# Altium footprint library Generic Footprint.PcbLib: 160 footprints (part 15 of 20) (continued)
## Symbol_FCC-Logo-3x2mm_Silkscreen [mm] (continued)
1(1.586,1.464) 1(1.586,1.64) 1(1.586,1.957) 1(1.586,1.963) 1(1.589,0.138) 1(1.589,0.457) 1(1.589,0.634) 1(1.589,0.641) 1(1.589,0.644) 1(1.589,0.648) 1(1.589,0.651) 1(1.589,1.453) 1(1.589,1.457) 1(1.589,1.46) 1(1.589,1.464) 1(1.589,1.467) 1(1.589,1.651) 1(1.589,1.957) 1(1.589,1.96) 1(1.593,0.454) 1(1.593,0.457) 1(1.593,0.461) 1(1.593,0.637) 1(1.593,0.641) 1(1.593,0.644) 1(1.593,1.464) 1(1.593,1.467) 1(1.593,1.47) 1(1.593,1.644) 1(1.593,1.651) 1(1.593,1.967) 1(1.596,0.134) 1(1.596,0.454) 1(1.596,0.631) 1(1.596,0.634) 1(1.596,1.474) 1(1.596,1.647) 1(1.596,1.657) 1(1.596,1.96) 1(1.596,1.963) 1(1.6,0.45) 1(1.6,0.627) 1(1.6,0.637) 1(1.6,1.467) 1(1.6,1.47) 1(1.6,1.477) 1(1.6,1.651) 1(1.6,1.657) 1(1.603,0.444) 1(1.603,0.624) 1(1.603,0.627) 1(1.603,0.631) 1(1.603,0.634) 1(1.603,1.47) 1(1.603,1.474) 1(1.603,1.481) 1(1.603,1.654) 1(1.603,1.661) 1(1.603,1.963) 1(1.603,1.97) 1(1.606,0.131) 1(1.606,0.138) 1(1.606,0.44) 1(1.606,0.444) 1(1.606,0.62) 1(1.606,0.624) 1(1.606,0.631) 1(1.606,1.474) 1(1.606,1.481) 1(1.606,1.484) 1(1.606,1.664) 1(1.606,1.967) 1(1.606,1.97) 1(1.606,1.974) 1(1.61,0.127) 1(1.61,0.138) 1(1.61,0.437) 1(1.61,0.44) 1(1.61,0.447) 1(1.61,0.617) 1(1.61,0.62) 1(1.61,0.624) 1(1.61,0.627) 1(1.61,1.481) 1(1.61,1.484) 1(1.61,1.487) 1(1.61,1.657) 1(1.61,1.661) 1(1.61,1.664) 1(1.61,1.967) 1(1.61,1.97) 1(1.613,0.131) 1(1.613,0.134) 1(1.613,0.433) 1(1.613,0.437) 1(1.613,0.44) 1(1.613,0.444) 1(1.613,0.614) 1(1.613,1.491) 1(1.613,1.661) 1(1.613,1.671) 1(1.613,1.97) 1(1.613,1.974) 1(1.613,1.977) 1(1.617,0.134) 1(1.617,0.43) 1(1.617,0.433) 1(1.617,0.437) 1(1.617,0.61) 1(1.617,0.617) 1(1.617,0.62) 1(1.617,1.484) 1(1.617,1.487) 1(1.617,1.494) 1(1.617,1.664) 1(1.617,1.671) 1(1.617,1.97) 1(1.62,0.124) 1(1.62,0.127) 1(1.62,0.131) 1(1.62,0.603) 1(1.62,0.607) 1(1.62,0.617) 1(1.62,1.487) 1(1.62,1.491) 1(1.62,1.494) 1(1.62,1.498) 1(1.62,1.974) 1(1.62,1.977) 1(1.62,1.98) 1(1.623,0.43) 1(1.623,0.6) 1(1.623,0.607) 1(1.623,1.491) 1(1.623,1.498) 1(1.623,1.501) 1(1.623,1.668) 1(1.627,0.433) 1(1.627,0.603) 1(1.627,0.607) 1(1.627,1.494) 1(1.627,1.498) 1(1.627,1.501) 1(1.627,1.504) 1(1.627,1.671) 1(1.627,1.977) 1(1.627,1.98) 1(1.627,1.984) 1(1.63,0.121) 1(1.63,0.124) 1(1.63,0.127) 1(1.63,0.597) 1(1.63,0.6) 1(1.63,1.508) 1(1.63,1.678) 1(1.634,0.43) 1(1.634,0.593) 1(1.634,0.597) 1(1.634,0.603) 1(1.634,1.501) 1(1.634,1.504) 1(1.634,1.511) 1(1.634,1.674) 1(1.634,1.678) 1(1.634,1.681) 1(1.634,1.98) 1(1.634,1.987) 1(1.637,0.117) 1(1.637,0.124) 1(1.637,0.427) 1(1.637,0.59) 1(1.637,0.593) 1(1.637,0.6) 1(1.637,1.504) 1(1.637,1.508) 1(1.637,1.515) 1(1.637,1.678) 1(1.637,1.681) 1(1.637,1.688) 1(1.64,0.121) 1(1.64,0.423) 1(1.64,0.586) 1(1.64,0.59) 1(1.64,0.597) 1(1.64,1.508) 1(1.64,1.515) 1(1.64,1.518) 1(1.64,1.681) 1(1.644,0.114) 1(1.644,0.121) 1(1.644,0.413) 1(1.644,0.583) 1(1.644,0.586) 1(1.644,0.59) 1(1.644,0.593) 1(1.644,1.515) 1(1.644,1.518) 1(1.644,1.521) 1(1.644,1.688) 1(1.644,1.691) 1(1.644,1.991) 1(1.647,0.11) 1(1.647,0.42) 1(1.647,0.58) 1(1.647,1.525) 1(1.647,1.685) 1(1.651,0.41) 1(1.651,0.413) 1(1.651,0.416) 1(1.651,0.583) 1(1.651,0.586) 1(1.651,1.518) 1(1.651,1.521) 1(1.651,1.688) 1(1.651,1.691) 1(1.651,1.695) 1(1.651,1.994) 1(1.654,0.107) 1(1.654,0.406) 1(1.654,0.573) 1(1.654,0.576) 1(1.654,0.58) 1(1.654,1.991) 1(1.657,0.406) 1(1.657,0.41) 1(1.657,0.413) 1(1.657,0.58) 1(1.657,0.583) 1(1.657,1.521) 1(1.657,1.525) 1(1.657,1.532) 1(1.657,1.691) 1(1.657,1.695) 1(1.657,1.991) 1(1.661,0.399) 1(1.661,0.41) 1(1.661,0.569) 1(1.661,0.573) 1(1.661,1.525) 1(1.661,1.528) 1(1.661,1.532) 1(1.661,1.535) 1(1.661,1.994) 1(1.661,1.997) 1(1.664,0.11) 1(1.664,0.566) 1(1.664,0.569) 1(1.664,1.538) 1(1.664,1.695) 1(1.668,0.104) 1(1.668,0.11) 1(1.668,0.399) 1(1.668,0.406) 1(1.668,0.573) 1(1.668,1.532) 1(1.668,1.535) 1(1.668,1.542) 1(1.668,1.698) 1(1.671,0.107) 1(1.671,0.396) 1(1.671,0.563) 1(1.671,0.569) 1(1.671,1.535) 1(1.671,1.538) 1(1.671,1.994) 1(1.671,1.997) 1(1.671,2.001) 1(1.674,0.403) 1(1.674,0.559) 1(1.674,0.566) 1(1.674,1.538) 1(1.674,1.545) 1(1.674,1.702) 1(1.674,1.708) 1(1.678,0.396) 1(1.678,0.552) 1(1.678,0.556) 1(1.678,0.559) 1(1.678,0.563) 1(1.678,0.566) 1(1.678,1.549) 1(1.678,1.708) 1(1.678,1.712) 1(1.678,1.997) 1(1.678,2.001) 1(1.678,2.004) 1(1.681,0.1) 1(1.681,0.107) 1(1.681,0.399) 1(1.681,0.563) 1(1.681,1.552) 1(1.681,1.705) 1(1.685,0.097) 1(1.685,0.104) 1(1.685,0.396) 1(1.685,0.549) 1(1.685,0.559) 1(1.685,1.549) 1(1.685,1.712) 1(1.685,2.008) 1(1.688,0.097) 1(1.688,0.104) 1(1.688,1.015) 1(1.688,1.018) 1(1.688,1.022) 1(1.688,1.025) 1(1.688,1.028) 1(1.688,1.032) 1(1.688,1.035) 1(1.688,1.039) 1(1.688,1.042) 1(1.688,1.045) 1(1.688,1.049) 1(1.688,1.052) 1(1.688,1.056) 1(1.688,1.059) 1(1.688,1.062) 1(1.688,1.066) 1(1.688,1.069) 1(1.688,1.073) 1(1.688,1.076) 1(1.688,1.079) 1(1.688,1.083) 1(1.688,1.086) 1(1.688,1.555) 1(1.688,1.708) 1(1.688,1.715) 1(1.688,1.719) 1(1.691,0.093) 1(1.691,0.1) 1(1.691,0.393) 1(1.691,0.546) 1(1.691,0.549) 1(1.691,0.552) 1(1.691,0.991) 1(1.691,0.994) 1(1.691,0.998) 1(1.691,1.001) 1(1.691,1.005) 1(1.691,1.008) 1(1.691,1.011) 1(1.691,1.018) 1(1.691,1.022) 1(1.691,1.025) 1(1.691,1.028) 1(1.691,1.032) 1(1.691,1.035) 1(1.691,1.039) 1(1.691,1.042) 1(1.691,1.045) 1(1.691,1.049) 1(1.691,1.052) 1(1.691,1.056) 1(1.691,1.059) 1(1.691,1.062) 1(1.691,1.066) 1(1.691,1.069) 1(1.691,1.073) 1(1.691,1.076) 1(1.691,1.079) 1(1.691,1.083) 1(1.691,1.086) 1(1.691,1.09) 1(1.691,1.093) 1(1.691,1.096) 1(1.691,1.1) 1(1.691,1.103) 1(1.691,1.107) 1(1.691,1.11) 1(1.691,1.113) 1(1.691,1.549) 1(1.691,1.552) 1(1.691,1.559) 1(1.691,1.712) 1(1.691,1.719) 1(1.691,2.001) 1(1.691,2.004) 1(1.691,2.008) 1(1.691,2.011) 1(1.695,0.382) 1(1.695,0.389) 1(1.695,0.552) 1(1.695,0.991) 1(1.695,0.994) 1(1.695,0.998) 1(1.695,1.001) 1(1.695,1.005) 1(1.695,1.008) 1(1.695,1.011) 1(1.695,1.018) 1(1.695,1.022) 1(1.695,1.025) 1(1.695,1.028) 1(1.695,1.032) 1(1.695,1.035) 1(1.695,1.039) 1(1.695,1.042) 1(1.695,1.045) 1(1.695,1.049) 1(1.695,1.052) 1(1.695,1.056) 1(1.695,1.059) 1(1.695,1.062) 1(1.695,1.066) 1(1.695,1.069) 1(1.695,1.073) 1(1.695,1.076) 1(1.695,1.079) 1(1.695,1.083) 1(1.695,1.086) 1(1.695,1.093) 1(1.695,1.096) 1(1.695,1.1) 1(1.695,1.103) 1(1.695,1.107) 1(1.695,1.11) 1(1.695,1.113) 1(1.695,1.552) 1(1.695,1.555) 1(1.695,1.562) 1(1.695,1.715) 1(1.695,1.722) 1(1.698,0.542) 1(1.698,0.991) 1(1.698,0.994) 1(1.698,0.998) 1(1.698,1.001) 1(1.698,1.005) 1(1.698,1.008) 1(1.698,1.096) 1(1.698,1.1) 1(1.698,1.103) 1(1.698,1.107) 1(1.698,1.11) 1(1.698,1.555) 1(1.698,1.559) 1(1.698,1.566) 1(1.698,1.715) 1(1.698,2.004) 1(1.698,2.008) 1(1.702,0.09) 1(1.702,0.093) 1(1.702,0.097) 1(1.702,0.1) 1(1.702,0.379) 1(1.702,0.382) 1(1.702,0.386) 1(1.702,0.539) 1(1.702,0.549) 1(1.702,0.947) 1(1.702,0.954) 1(1.702,1.011) 1(1.702,1.093) 1(1.702,1.113) 1(1.702,1.151) 1(1.702,1.158) 1(1.702,1.562) 1(1.702,1.722) 1(1.702,1.725) 1(1.702,2.014) 1(1.705,0.535) 1(1.705,0.539) 1(1.705,0.542) 1(1.705,0.933) 1(1.705,0.937) 1(1.705,0.94) 1(1.705,0.947) 1(1.705,0.954) 1(1.705,0.971) 1(1.705,0.974) 1(1.705,0.977) 1(1.705,0.981) 1(1.705,0.984) 1(1.705,0.988) 1(1.705,1.117) 1(1.705,1.12) 1(1.705,1.124) 1(1.705,1.127) 1(1.705,1.13) 1(1.705,1.151) 1(1.705,1.158) 1(1.705,1.161) 1(1.705,1.164) 1(1.705,1.168) 1(1.705,1.171) 1(1.705,1.559) 1(1.705,1.562) 1(1.705,1.569) 1(1.705,1.719) 1(1.705,1.725) 1(1.705,1.729) 1(1.708,0.376) 1(1.708,0.382) 1(1.708,0.923) 1(1.708,0.926) 1(1.708,0.93) 1(1.708,0.933) 1(1.708,0.937) 1(1.708,0.94) 1(1.708,0.957) 1(1.708,0.96) 1(1.708,0.964) 1(1.708,0.967) 1(1.708,1.134) 1(1.708,1.137) 1(1.708,1.141) 1(1.708,1.144) 1(1.708,1.147) 1(1.708,1.161) 1(1.708,1.164) 1(1.708,1.168) 1(1.708,1.171) 1(1.708,1.175) 1(1.708,1.178) 1(1.708,1.181) 1(1.708,1.572) 1(1.708,1.722) 1(1.708,2.018) 1(1.712,0.087) 1(1.712,0.09) 1(1.712,0.093) 1(1.712,0.379) 1(1.712,0.532) 1(1.712,0.535) 1(1.712,0.539) 1(1.712,0.542) 1(1.712,0.916) 1(1.712,0.92) 1(1.712,0.923) 1(1.712,0.926) 1(1.712,0.93) 1(1.712,0.94) 1(1.712,0.943) 1(1.712,0.947) 1(1.712,0.95) 1(1.712,0.954) 1(1.712,1.151) 1(1.712,1.154) 1(1.712,1.158) 1(1.712,1.161) 1(1.712,1.164) 1(1.712,1.175) 1(1.712,1.178) 1(1.712,1.181) 1(1.712,1.185) 1(1.712,1.188) 1(1.712,1.729) 1(1.715,0.376) 1(1.715,0.529) 1(1.715,0.913) 1(1.715,0.923) 1(1.715,0.93) 1(1.715,0.933) 1(1.715,0.937) 1(1.715,1.168) 1(1.715,1.171) 1(1.715,1.175) 1(1.715,1.181) 1(1.715,1.192) 1(1.715,1.576) 1(1.719,0.369) 1(1.719,0.372) 1(1.719,0.379) 1(1.719,0.532) 1(1.719,0.535) 1(1.719,0.906) 1(1.719,0.909) 1(1.719,0.913) 1(1.719,0.916) 1(1.719,0.92) 1(1.719,0.926) 1(1.719,1.178) 1(1.719,1.185) 1(1.719,1.188) 1(1.719,1.195) 1(1.719,1.198) 1(1.719,1.572) 1(1.719,1.725) 1(1.722,0.09) 1(1.722,0.369) 1(1.722,0.372) 1(1.722,0.899) 1(1.722,0.903) 1(1.722,0.906) 1(1.722,0.913) 1(1.722,0.916) 1(1.722,0.92) 1(1.722,1.185) 1(1.722,1.188) 1(1.722,1.195) 1(1.722,1.202) 1(1.722,1.205) 1(1.722,1.579) 1(1.722,2.021) 1(1.725,0.083) 1(1.725,0.365) 1(1.725,0.369) 1(1.725,0.376) 1(1.725,0.522) 1(1.725,0.525) 1(1.725,0.532) 1(1.725,0.896) 1(1.725,0.899) 1(1.725,0.903) 1(1.725,0.906) 1(1.725,1.195) 1(1.725,1.202) 1(1.725,1.205) 1(1.725,1.209) 1(1.725,1.572) 1(1.725,1.729) 1(1.729,0.08) 1(1.729,0.369) 1(1.729,0.372) 1(1.729,0.518) 1(1.729,0.899) 1(1.729,0.903) 1(1.729,1.202) 1(1.729,1.205) 1(1.729,1.579) 1(1.729,1.583) 1(1.729,1.586) 1(1.729,1.732) 1(1.729,2.025) 1(1.732,0.076) 1(1.732,0.365) 1(1.732,0.879) 1(1.732,0.889) 1(1.732,1.215) 1(1.732,1.583) 1(1.732,2.018) 1(1.736,0.515) 1(1.736,0.869) 1(1.736,0.872) 1(1.736,0.875) 1(1.736,0.879) 1(1.736,0.892) 1(1.736,1.212) 1(1.736,1.229) 1(1.736,1.232) 1(1.736,1.236) 1(1.736,1.579) 1(1.736,1.586) 1(1.736,1.739) 1(1.739,0.369) 1(1.739,0.518) 1(1.739,0.865) 1(1.739,0.872) 1(1.739,0.875) 1(1.739,0.879) 1(1.739,0.882) 1(1.739,0.886) 1(1.739,1.219) 1(1.739,1.222) 1(1.739,1.229) 1(1.739,1.232) 1(1.739,1.239) 1(1.739,1.243) 1(1.739,1.583) 1(1.739,1.589) 1(1.739,1.736) 1(1.739,1.739) 1(1.739,1.742) 1(1.739,2.018) 1(1.742,0.858) 1(1.742,0.862) 1(1.742,0.865) 1(1.742,0.869) 1(1.742,0.872) 1(1.742,0.875) 1(1.742,1.226) 1(1.742,1.229) 1(1.742,1.239) 1(1.742,1.246) 1(1.742,2.021) 1(1.742,2.025) 1(1.742,2.028) 1(1.746,0.365) 1(1.746,0.512) 1(1.746,0.515) 1(1.746,0.518) 1(1.746,0.858) 1(1.746,0.862) 1(1.746,0.865) 1(1.746,0.869) 1(1.746,1.232) 1(1.746,1.239) 1(1.746,1.243) 1(1.746,1.249) 1(1.746,1.586) 1(1.746,1.589) 1(1.746,1.593) 1(1.746,1.739) 1(1.746,1.742) 1(1.746,1.746) 1(1.749,0.073) 1(1.749,0.359) 1(1.749,0.852) 1(1.749,0.855) 1(1.749,0.862) 1(1.749,1.253) 1(1.753,0.355) 1(1.753,0.359) 1(1.753,0.362) 1(1.753,0.512) 1(1.753,0.515) 1(1.753,0.845) 1(1.753,0.848) 1(1.753,0.852) 1(1.753,0.858) 1(1.753,1.243) 1(1.753,1.253) 1(1.753,1.256) 1(1.753,1.26) 1(1.753,1.589) 1(1.753,1.596) 1(1.753,1.742) 1(1.753,1.746) 1(1.753,1.749) 1(1.753,2.021) 1(1.753,2.028) 1(1.753,2.031) 1(1.756,0.352) 1(1.756,0.505) 1(1.756,0.845) 1(1.756,0.848) 1(1.756,0.852) 1(1.756,1.256) 1(1.756,1.6) 1(1.756,1.753) 1(1.756,2.025) 1(1.759,0.076) 1(1.759,0.501) 1(1.759,0.508) 1(1.759,0.512) 1(1.759,0.845) 1(1.759,0.848) 1(1.759,1.253) 1(1.759,1.256) 1(1.759,1.6) 1(1.759,1.603) 1(1.759,1.746) 1(1.763,0.359) 1(1.763,0.505) 1(1.763,0.508) 1(1.763,0.841) 1(1.763,1.6) 1(1.763,1.749) 1(1.763,1.753) 1(1.763,1.756) 1(1.763,2.035) 1(1.766,0.07) 1(1.766,0.076) 1(1.766,0.348) 1(1.766,0.352) 1(1.766,0.498) 1(1.766,0.508) 1(1.766,0.828) 1(1.766,1.263) 1(1.766,1.27) 1(1.766,1.277) 1(1.766,1.606) 1(1.766,1.749) 1(1.766,2.028) 1(1.766,2.031) 1(1.77,0.073) 1(1.77,0.501) 1(1.77,0.505) 1(1.77,0.821) 1(1.77,0.824) 1(1.77,0.838) 1(1.77,1.266) 1(1.77,1.273) 1(1.77,1.277) 1(1.77,1.28) 1(1.77,1.603) 1(1.773,0.345) 1(1.773,0.348) 1(1.773,0.352) 1(1.773,0.818) 1(1.773,0.824) 1(1.773,0.831) 1(1.773,0.835) 1(1.773,1.277) 1(1.773,1.28) 1(1.773,1.283) 1(1.773,1.287) 1(1.773,1.61) 1(1.773,1.756) 1(1.773,1.759) 1(1.776,0.495) 1(1.776,0.501) 1(1.776,0.811) 1(1.776,0.814) 1(1.776,0.821) 1(1.776,0.824) 1(1.776,1.28) 1(1.776,1.283) 1(1.776,1.287) 1(1.776,1.29) 1(1.776,1.294) 1(1.776,1.753) 1(1.78,0.066) 1(1.78,0.07) 1(1.78,0.073) 1(1.78,0.342) 1(1.78,0.345) 1(1.78,0.814) 1(1.78,0.818) 1(1.78,0.821) 1(1.78,1.283) 1(1.78,1.287) 1(1.78,1.29) 1(1.78,1.294) 1(1.78,1.603) 1(1.78,1.606) 1(1.78,1.759) 1(1.78,2.031) 1(1.78,2.035) 1(1.78,2.038) 1(1.783,0.066) 1(1.783,0.348) 1(1.783,0.491) 1(1.783,0.498) 1(1.783,0.807) 1(1.783,0.818) 1(1.783,1.29) 1(1.783,1.297) 1(1.783,1.613) 1(1.787,0.066) 1(1.787,0.488) 1(1.787,0.498) 1(1.787,0.807) 1(1.787,0.814) 1(1.787,1.294) 1(1.787,1.297) 1(1.787,1.3) 1(1.787,1.606) 1(1.787,1.61) 1(1.79,0.063) 1(1.79,0.338) 1(1.79,0.342) 1(1.79,0.807) 1(1.79,1.297) 1(1.79,1.3) 1(1.79,1.304) 1(1.79,1.613) 1(1.79,1.617) 1(1.79,1.756) 1(1.79,2.042) 1(1.793,0.059) 1(1.793,0.07) 1(1.793,0.335) 1(1.793,0.345) 1(1.793,0.491) 1(1.793,0.495) 1(1.793,0.797) 1(1.793,0.804) 1(1.793,1.3) 1(1.793,1.304) 1(1.793,1.307) 1(1.793,1.311) 1(1.793,1.61) 1(1.793,1.613) 1(1.793,1.617) 1(1.793,1.62) 1(1.793,2.035) 1(1.793,2.045) 1(1.797,0.063) 1(1.797,0.066) 1(1.797,0.484) 1(1.797,0.488) 1(1.797,0.491) 1(1.797,0.495) 1(1.797,0.79) 1(1.797,0.794) 1(1.797,0.797) 1(1.797,0.801) 1(1.797,1.304) 1(1.797,1.307) 1(1.797,1.613) 1(1.797,1.759) 1(1.8,0.335) 1(1.8,0.338) 1(1.8,0.794) 1(1.8,0.797) 1(1.8,1.307) 1(1.8,1.311) 1(1.8,1.314) 1(1.804,0.342) 1(1.804,0.481) 1(1.804,0.484) 1(1.804,0.784) 1(1.804,0.787) 1(1.804,0.79) 1(1.804,0.794) 1(1.804,1.311) 1(1.804,1.314) 1(1.804,1.317) 1(1.804,1.613) 1(1.804,1.617) 1(1.804,1.62) 1(1.807,0.066) 1(1.807,0.488) 1(1.807,0.78) 1(1.807,0.787) 1(1.807,0.79) 1(1.807,1.314) 1(1.807,1.317) 1(1.807,1.321) 1(1.807,1.623) 1(1.807,1.763) 1(1.807,2.048) 1(1.81,0.056) 1(1.81,0.059) 1(1.81,0.063) 1(1.81,0.338) 1(1.81,0.78) 1(1.81,0.784) 1(1.81,0.787) 1(1.81,1.317) 1(1.81,1.321) 1(1.81,1.766) 1(1.81,1.773) 1(1.814,0.478) 1(1.814,0.481) 1(1.814,0.484) 1(1.814,0.784) 1(1.814,1.321) 1(1.814,1.62) 1(1.814,1.623) 1(1.814,1.627) 1(1.817,0.78) 1(1.817,1.324) 1(1.817,1.331) 1(1.821,0.328) 1(1.821,0.335) 1(1.821,1.328) 1(1.821,1.331) 1(1.821,1.334) 1(1.821,1.623) 1(1.821,1.63) 1(1.821,1.77) 1(1.821,1.773) 1(1.821,1.776) 1(1.821,2.045) 1(1.824,0.053) 1(1.824,0.059) 1(1.824,0.471) 1(1.824,0.474) 1(1.824,0.478) 1(1.824,0.481) 1(1.824,0.77) 1(1.824,0.777) 1(1.824,1.634) 1(1.824,2.045) 1(1.824,2.052) 1(1.827,0.77) 1(1.827,0.773) 1(1.827,1.331) 1(1.827,1.334) 1(1.827,1.338) 1(1.831,0.467) 1(1.831,0.471) 1(1.831,0.474) 1(1.831,0.478) 1(1.831,1.338) 1(1.831,1.341) 1(1.831,1.637) 1(1.831,1.776) 1(1.831,1.78) 1(1.831,2.045) 1(1.834,0.325) 1(1.834,0.328) 1(1.834,0.471) 1(1.834,0.474) 1(1.834,0.767) 1(1.834,0.77) 1(1.834,1.334) 1(1.834,1.341) 1(1.834,1.773) 1(1.834,2.045) 1(1.838,0.331) 1(1.838,0.756) 1(1.838,0.76) 1(1.838,0.763) 1(1.838,1.338) 1(1.838,1.341) 1(1.838,2.048) 1(1.841,0.753) 1(1.841,0.76) 1(1.841,1.783) 1(1.841,2.055) 1(1.844,0.049) 1(1.844,0.321) 1(1.844,0.464) 1(1.844,0.756) 1(1.844,0.76) 1(1.844,1.345) 1(1.844,1.634) 1(1.844,1.64) 1(1.844,1.776) 1(1.844,1.78) 1(1.844,1.787) 1(1.844,2.055) 1(1.848,0.318) 1(1.848,0.325) 1(1.848,0.328) 1(1.848,0.753) 1(1.848,0.756) 1(1.848,1.634) 1(1.851,1.348) 1(1.851,1.355) 1(1.851,1.637) 1(1.855,0.461) 1(1.855,1.355) 1(1.855,2.048) 1(1.855,2.055) 1(1.858,0.046) 1(1.858,0.753) 1(1.858,1.351) 1(1.858,1.362) 1(1.858,1.637) 1(1.858,1.78) 1(1.858,1.783) 1(1.858,1.787) 1(1.858,2.052) 1(1.858,2.059) 1(1.861,0.314) 1(1.861,0.318) 1(1.861,0.321) 1(1.861,0.325) 1(1.861,0.746) 1(1.861,0.75) 1(1.861,1.355) 1(1.861,1.362) 1(1.861,1.365) 1(1.861,1.64) 1(1.861,1.644) 1(1.861,1.79) 1(1.865,0.321) 1(1.865,0.457) 1(1.865,0.464) 1(1.865,0.739) 1(1.865,1.358) 1(1.868,0.736) 1(1.868,0.739) 1(1.868,0.743) 1(1.868,1.365) 1(1.868,1.368) 1(1.872,0.314) 1(1.872,0.464) 1(1.872,1.362) 1(1.872,1.368) 1(1.872,1.372) 1(1.872,1.64) 1(1.872,1.644) 1(1.872,1.783) 1(1.872,1.79) 1(1.875,0.311) 1(1.875,0.318) 1(1.875,0.733) 1(1.875,0.736) 1(1.875,1.365) 1(1.875,1.651) 1(1.875,1.793) 1(1.875,2.052) 1(1.875,2.055) 1(1.875,2.059) 1(1.875,2.062) 1(1.878,0.042) 1(1.878,0.454) 1(1.878,0.461) 1(1.878,0.729) 1(1.878,0.736) 1(1.878,0.739) 1(1.882,0.046) 1(1.882,0.049) 1(1.882,0.726) 1(1.882,0.733) 1(1.882,1.368) 1(1.882,1.372) 1(1.882,1.793) 1(1.885,0.049) 1(1.885,0.45) 1(1.885,0.454) 1(1.885,0.461) 1(1.885,1.644) 1(1.885,1.651) 1(1.889,0.457) 1(1.889,0.722) 1(1.889,0.726) 1(1.889,0.733) 1(1.889,1.372) 1(1.889,1.654) 1(1.889,1.787) 1(1.892,0.049) 1(1.892,0.308) 1(1.892,0.311) 1(1.895,0.314) 1(1.895,0.719) 1(1.895,0.722) 1(1.895,1.375) 1(1.895,1.647) 1(1.895,2.055) 1(1.899,0.046) 1(1.899,0.049) 1(1.899,0.457) 1(1.899,0.726) 1(1.899,1.651) 1(1.899,1.654) 1(1.899,1.657) 1(1.899,2.059) 1(1.899,2.062) 1(1.899,2.065) 1(1.902,0.039) 1(1.902,0.042) 1(1.902,0.447) 1(1.902,0.45) 1(1.902,0.454) 1(1.902,0.719) 1(1.902,1.379) 1(1.902,1.385) 1(1.906,0.308) 1(1.906,0.716) 1(1.906,1.79) 1(1.909,0.716) 1(1.909,0.722) 1(1.909,1.382) 1(1.909,1.385) 1(1.909,1.389) 1(1.909,1.797) 1(1.912,1.654) 1(1.912,1.661) 1(1.916,0.444) 1(1.916,0.447) 1(1.916,0.45) 1(1.916,1.392) 1(1.916,1.797) 1(1.919,1.385) 1(1.919,1.389) 1(1.919,1.396) 1(1.919,1.797) 1(1.919,2.069) 1(1.923,0.719) 1(1.923,1.797) 1(1.923,2.062) 1(1.923,2.065) 1(1.926,0.311) 1(1.926,0.716) 1(1.926,1.389) 1(1.926,1.392) 1(1.926,1.396) 1(1.926,1.793) 1(1.926,1.8) 1(1.926,1.804) 1(1.929,0.036) 1(1.929,0.039) 1(1.929,0.042) 1(1.929,0.705) 1(1.929,0.712) 1(1.929,1.399) 1(1.933,1.392) 1(1.933,1.657) 1(1.933,1.664) 1(1.936,0.44) 1(1.936,0.444) 1(1.936,0.447) 1(1.936,1.396) 1(1.936,1.399) 1(1.936,1.402) 1(1.936,1.657) 1(1.94,0.437) 1(1.94,0.702) 1(1.94,0.705) 1(1.94,0.709) 1(1.94,1.657) 1(1.946,1.402) 1(1.946,1.657) 1(1.946,1.797) 1(1.946,1.804) 1(1.946,1.807) 1(1.95,0.308) 1(1.95,0.699) 1(1.95,0.702) 1(1.95,1.399) 1(1.95,1.406) 1(1.95,1.668) 1(1.953,0.297) 1(1.953,0.304) 1(1.953,0.433) 1(1.953,0.444) 1(1.953,0.705) 1(1.953,1.406) 1(1.953,1.661) 1(1.953,2.065) 1(1.953,2.072) 1(1.957,0.032) 1(1.957,0.039) 1(1.957,0.297) 1(1.957,1.406) 1(1.96,0.036) 1(1.96,0.695) 1(1.96,1.406) 1(1.96,1.661) 1(1.963,0.297) 1(1.963,0.692) 1(1.963,0.699) 1(1.963,0.702) 1(1.967,1.661) 1(1.97,1.661) 1(1.97,1.671) 1(1.974,0.297) 1(1.974,1.668) 1(1.977,0.297) 1(1.977,0.692) 1(1.977,0.695) 1(1.977,0.699) 1(1.977,1.402) 1(1.977,1.804) 1(1.977,1.807) 1(1.977,1.81) 1(1.98,0.297) 1(1.98,0.43) 1(1.98,0.688) 1(1.984,0.294) 1(1.984,0.301) 1(1.991,0.688) 1(1.994,0.688) 1(1.994,1.406) 1(1.994,2.076) 1(1.997,0.688) 1(1.997,0.695) 1(1.997,1.409) 1(1.997,1.416) 1(2.001,2.079) 1(2.004,0.685) 1(2.004,1.668) 1(2.004,1.671) 1(2.004,1.674) 1(2.008,0.685) 1(2.011,0.025) 1(2.011,0.029) 1(2.011,0.032) 1(2.011,0.036) 1(2.014,0.427) 1(2.014,0.433) 1(2.014,0.685) 1(2.021,0.685) 1(2.025,0.685) 1(2.025,1.413) 1(2.025,1.416) 1(2.025,1.419) 1(2.028,0.692) 1(2.031,0.685) 1(2.031,1.807) 1(2.035,1.81) 1(2.035,1.814) 1(2.082,1.807) 1(2.086,1.81) 1(2.086,1.814) 1(2.089,0.685) 1(2.089,0.692) 1(2.093,0.685) 1(2.096,1.413) 1(2.096,1.416) 1(2.096,1.419) 1(2.099,0.427) 1(2.099,0.433) 1(2.099,0.685) 1(2.103,0.032) 1(2.106,0.025) 1(2.106,0.036) 1(2.106,0.685) 1(2.11,0.029) 1(2.11,0.685) 1(2.11,1.668) 1(2.11,1.671) 1(2.113,1.674) 1(2.116,0.685) 1(2.116,2.079) 1(2.12,0.688) 1(2.12,0.695) 1(2.12,2.076) 1(2.123,0.688) 1(2.123,1.409) 1(2.123,1.416) 1(2.127,1.406) 1(2.13,0.688) 1(2.133,0.294) 1(2.133,0.297) 1(2.133,0.301) 1(2.137,0.297) 1(2.137,0.43) 1(2.137,0.688) 1(2.14,0.297) 1(2.14,0.692) 1(2.14,0.695) 1(2.14,0.699) 1(2.14,1.804) 1(2.14,1.807) 1(2.14,1.81) 1(2.144,1.664) 1(2.144,1.668) 1(2.147,1.661) 1(2.147,1.671) 1(2.15,1.402) 1(2.15,1.664) 1(2.154,0.297) 1(2.154,0.692) 1(2.154,0.695) 1(2.154,0.699) 1(2.154,0.702) 1(2.154,1.661) 1(2.157,0.297) 1(2.161,0.032) 1(2.161,0.036) 1(2.161,0.039) 1(2.161,0.297) 1(2.161,0.433) 1(2.161,1.661) 1(2.161,2.065) 1(2.164,0.304) 1(2.164,0.444) 1(2.164,1.399) 1(2.164,1.406) 1(2.164,1.661) 1(2.164,2.072) 1(2.167,0.308) 1(2.167,0.699) 1(2.167,0.702) 1(2.167,0.705) 1(2.167,1.399) 1(2.167,1.668) 1(2.171,1.399) 1(2.171,1.406) 1(2.171,1.657) 1(2.171,1.797) 1(2.171,1.804) 1(2.171,1.807) 1(2.174,1.402) 1(2.174,1.657) 1(2.178,0.702) 1(2.178,0.705) 1(2.178,0.709) 1(2.178,1.657) 1(2.181,0.437) 1(2.181,0.44) 1(2.181,0.444) 1(2.181,0.447) 1(2.181,1.661) 1(2.184,1.396) 1(2.184,1.399) 1(2.184,1.402) 